# Altium footprint library CONN_HDR_MINI_ST.PcbLib: 116 footprints (part 7 of 10)
Each footprint in its own frame and in the unit in brackets; x right, y up, seen from the top. Pads: shape width x height; smd on the part's side, far side on the other; paste and mask are expansions set on the pad; w line width, h text height; cw(c..) or ccw(c..) is an arc to the next point about the centre after c.
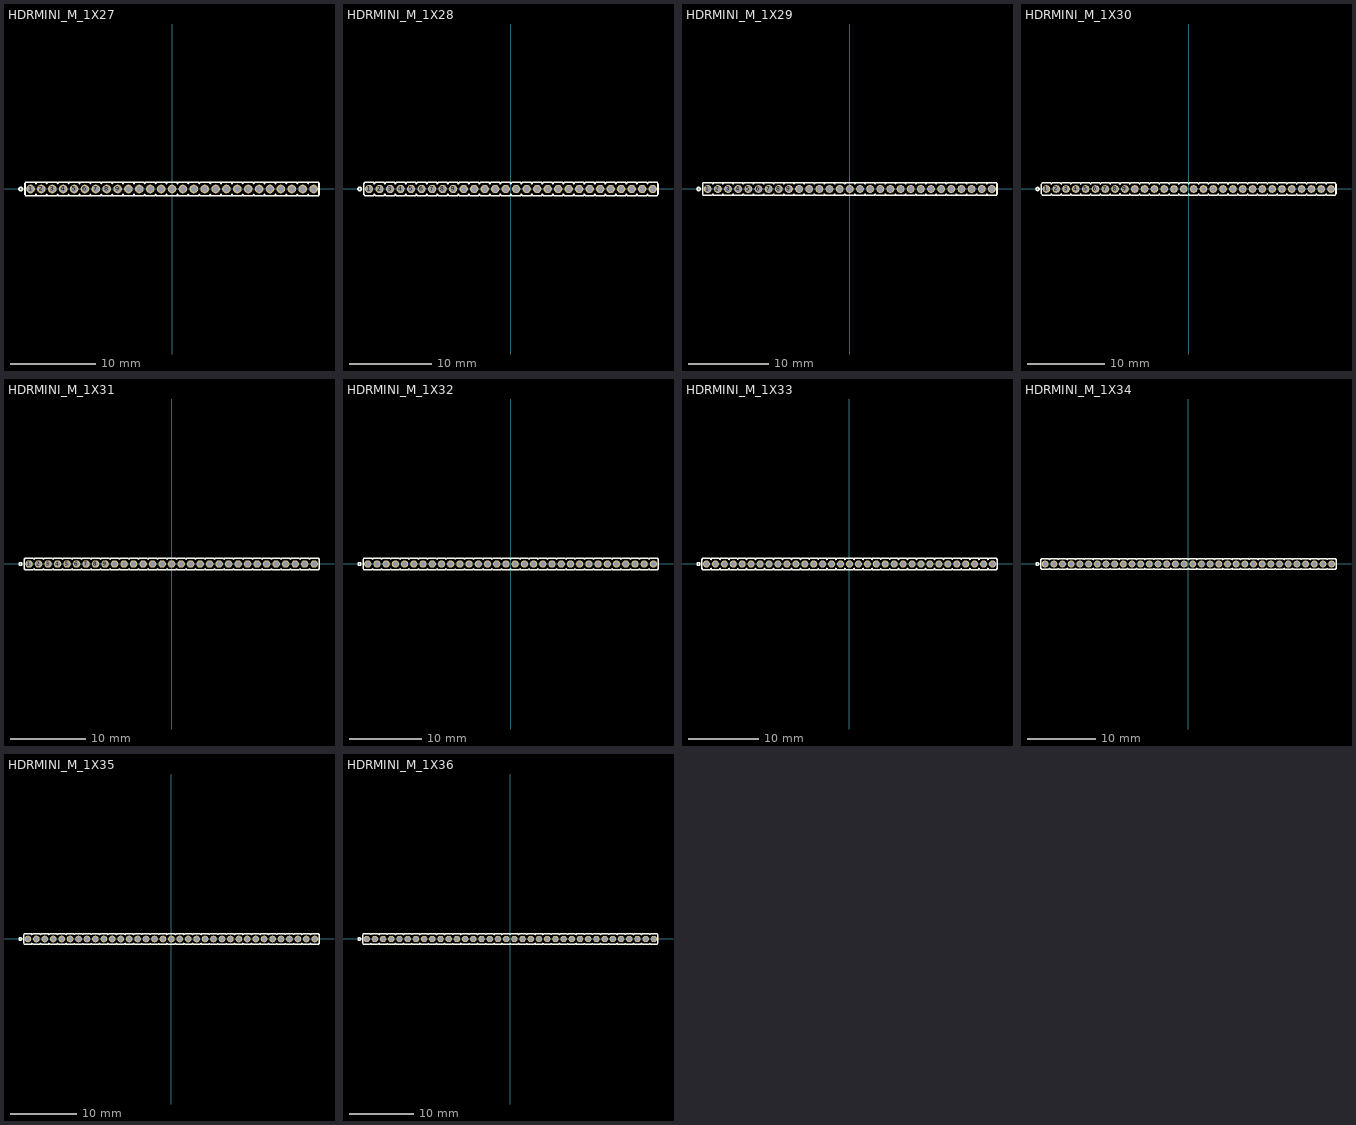
[diagram p6: the footprints below, top view; thin cyan lines are the x and y axes]

## HDRMINI_M_1X27 [mm] "mini header (50mil pitch)"
pads (27):
  round 1 / inner round 1 / far side oval 1x1.4 hole 0.7 mask+0.05: 1(-16.51,0) 2(-15.24,0) 3(-13.97,0) 4(-12.7,0) 5(-11.43,0) 6(-10.16,0) 7(-8.89,0) 8(-7.62,0) 9(-6.35,0) 10(-5.08,0) 11(-3.81,0) 12(-2.54,0) 13(-1.27,0) 14(0,0) 15(1.27,0) 16(2.54,0) 17(3.81,0) 18(5.08,0) 19(6.35,0) 20(7.62,0) 21(8.89,0) 22(10.16,0) 23(11.43,0) 24(12.7,0) 25(13.97,0) 26(15.24,0) 27(16.51,0)
Top Overlay:
  drawing of 165 lines, arcs and shapes, not listed
3D body: height 2.8, standoff 0, extent -6.985,-0.635 -5.715,0.635
3D body: height 7.3, standoff -2.5, extent -6.55,-0.2 -6.15,0.2
3D body: height 2.8, standoff 0, extent -8.255,-0.635 -6.985,0.635
3D body: height 7.3, standoff -2.5, extent -7.82,-0.2 -7.42,0.2
3D body: height 2.8, standoff 0, extent -9.525,-0.635 -8.255,0.635
3D body: height 7.3, standoff -2.5, extent -9.09,-0.2 -8.69,0.2
3D body: height 2.8, standoff 0, extent -10.795,-0.635 -9.525,0.635
3D body: height 7.3, standoff -2.5, extent -10.36,-0.2 -9.96,0.2
3D body: height 2.8, standoff 0, extent -12.065,-0.635 -10.795,0.635
3D body: height 7.3, standoff -2.5, extent -11.63,-0.2 -11.23,0.2
3D body: height 2.8, standoff 0, extent -13.335,-0.635 -12.065,0.635
3D body: height 7.3, standoff -2.5, extent -12.9,-0.2 -12.5,0.2
3D body: height 2.8, standoff 0, extent -14.605,-0.635 -13.335,0.635
3D body: height 7.3, standoff -2.5, extent -14.17,-0.2 -13.77,0.2
3D body: height 2.8, standoff 0, extent -15.875,-0.635 -14.605,0.635
3D body: height 7.3, standoff -2.5, extent -15.44,-0.2 -15.04,0.2
3D body: height 2.8, standoff 0, extent -17.145,-0.635 -15.875,0.635
3D body: height 7.3, standoff -2.5, extent -16.71,-0.2 -16.31,0.2
3D body: height 2.8, standoff 0, extent -5.715,-0.635 -4.445,0.635
3D body: height 7.3, standoff -2.5, extent -5.28,-0.2 -4.88,0.2
3D body: height 2.8, standoff 0, extent 5.715,-0.635 6.985,0.635
3D body: height 7.3, standoff -2.5, extent 6.15,-0.2 6.55,0.2
3D body: height 2.8, standoff 0, extent 4.445,-0.635 5.715,0.635
3D body: height 7.3, standoff -2.5, extent 4.88,-0.2 5.28,0.2
3D body: height 2.8, standoff 0, extent 3.175,-0.635 4.445,0.635
3D body: height 7.3, standoff -2.5, extent 3.61,-0.2 4.01,0.2
3D body: height 2.8, standoff 0, extent 1.905,-0.635 3.175,0.635
3D body: height 7.3, standoff -2.5, extent 2.34,-0.2 2.74,0.2
3D body: height 2.8, standoff 0, extent 0.635,-0.635 1.905,0.635
3D body: height 7.3, standoff -2.5, extent 1.07,-0.2 1.47,0.2
3D body: height 2.8, standoff 0, extent -0.635,-0.635 0.635,0.635
3D body: height 7.3, standoff -2.5, extent -0.2,-0.2 0.2,0.2
3D body: height 2.8, standoff 0, extent -1.905,-0.635 -0.635,0.635
3D body: height 7.3, standoff -2.5, extent -1.47,-0.2 -1.07,0.2
3D body: height 2.8, standoff 0, extent -3.175,-0.635 -1.905,0.635
3D body: height 7.3, standoff -2.5, extent -2.74,-0.2 -2.34,0.2
3D body: height 2.8, standoff 0, extent -4.445,-0.635 -3.175,0.635
3D body: height 7.3, standoff -2.5, extent -4.01,-0.2 -3.61,0.2
3D body: height 2.8, standoff 0, extent 6.985,-0.635 8.255,0.635
3D body: height 7.3, standoff -2.5, extent 7.42,-0.2 7.82,0.2
3D body: height 2.8, standoff 0, extent 15.875,-0.635 17.145,0.635
3D body: height 7.3, standoff -2.5, extent 16.31,-0.2 16.71,0.2
3D body: height 2.8, standoff 0, extent 14.605,-0.635 15.875,0.635
3D body: height 7.3, standoff -2.5, extent 15.04,-0.2 15.44,0.2
3D body: height 2.8, standoff 0, extent 13.335,-0.635 14.605,0.635
3D body: height 7.3, standoff -2.5, extent 13.77,-0.2 14.17,0.2
3D body: height 2.8, standoff 0, extent 12.065,-0.635 13.335,0.635
3D body: height 7.3, standoff -2.5, extent 12.5,-0.2 12.9,0.2
3D body: height 2.8, standoff 0, extent 10.795,-0.635 12.065,0.635
3D body: height 7.3, standoff -2.5, extent 11.23,-0.2 11.63,0.2
3D body: height 2.8, standoff 0, extent 9.525,-0.635 10.795,0.635
3D body: height 7.3, standoff -2.5, extent 9.96,-0.2 10.36,0.2
3D body: height 2.8, standoff 0, extent 8.255,-0.635 9.525,0.635
3D body: height 7.3, standoff -2.5, extent 8.69,-0.2 9.09,0.2

## HDRMINI_M_1X28 [mm] "mini header (50mil pitch)"
pads (28):
  round 1 / inner round 1 / far side oval 1x1.4 hole 0.7 mask+0.05: 1(-17.145,0) 2(-15.875,0) 3(-14.605,0) 4(-13.335,0) 5(-12.065,0) 6(-10.795,0) 7(-9.525,0) 8(-8.255,0) 9(-6.985,0) 10(-5.715,0) 11(-4.445,0) 12(-3.175,0) 13(-1.905,0) 14(-0.635,0) 15(0.635,0) 16(1.905,0) 17(3.175,0) 18(4.445,0) 19(5.715,0) 20(6.985,0) 21(8.255,0) 22(9.525,0) 23(10.795,0) 24(12.065,0) 25(13.335,0) 26(14.605,0) 27(15.875,0) 28(17.145,0)
Top Overlay:
  drawing of 171 lines, arcs and shapes, not listed
3D body: height 2.8, standoff 0, extent -7.62,-0.635 -6.35,0.635
3D body: height 7.3, standoff -2.5, extent -7.185,-0.2 -6.785,0.2
3D body: height 2.8, standoff 0, extent -8.89,-0.635 -7.62,0.635
3D body: height 7.3, standoff -2.5, extent -8.455,-0.2 -8.055,0.2
3D body: height 2.8, standoff 0, extent -10.16,-0.635 -8.89,0.635
3D body: height 7.3, standoff -2.5, extent -9.725,-0.2 -9.325,0.2
3D body: height 2.8, standoff 0, extent -11.43,-0.635 -10.16,0.635
3D body: height 7.3, standoff -2.5, extent -10.995,-0.2 -10.595,0.2
3D body: height 2.8, standoff 0, extent -12.7,-0.635 -11.43,0.635
3D body: height 7.3, standoff -2.5, extent -12.265,-0.2 -11.865,0.2
3D body: height 2.8, standoff 0, extent -13.97,-0.635 -12.7,0.635
3D body: height 7.3, standoff -2.5, extent -13.535,-0.2 -13.135,0.2
3D body: height 2.8, standoff 0, extent -15.24,-0.635 -13.97,0.635
3D body: height 7.3, standoff -2.5, extent -14.805,-0.2 -14.405,0.2
3D body: height 2.8, standoff 0, extent -16.51,-0.635 -15.24,0.635
3D body: height 7.3, standoff -2.5, extent -16.075,-0.2 -15.675,0.2
3D body: height 2.8, standoff 0, extent -17.78,-0.635 -16.51,0.635
3D body: height 7.3, standoff -2.5, extent -17.345,-0.2 -16.945,0.2
3D body: height 2.8, standoff 0, extent -6.35,-0.635 -5.08,0.635
3D body: height 7.3, standoff -2.5, extent -5.915,-0.2 -5.515,0.2
3D body: height 2.8, standoff 0, extent 5.08,-0.635 6.35,0.635
3D body: height 7.3, standoff -2.5, extent 5.515,-0.2 5.915,0.2
3D body: height 2.8, standoff 0, extent 3.81,-0.635 5.08,0.635
3D body: height 7.3, standoff -2.5, extent 4.245,-0.2 4.645,0.2
3D body: height 2.8, standoff 0, extent 2.54,-0.635 3.81,0.635
3D body: height 7.3, standoff -2.5, extent 2.975,-0.2 3.375,0.2
3D body: height 2.8, standoff 0, extent 1.27,-0.635 2.54,0.635
3D body: height 7.3, standoff -2.5, extent 1.705,-0.2 2.105,0.2
3D body: height 2.8, standoff 0, extent 0,-0.635 1.27,0.635
3D body: height 7.3, standoff -2.5, extent 0.435,-0.2 0.835,0.2
3D body: height 2.8, standoff 0, extent -1.27,-0.635 0,0.635
3D body: height 7.3, standoff -2.5, extent -0.835,-0.2 -0.435,0.2
3D body: height 2.8, standoff 0, extent -2.54,-0.635 -1.27,0.635
3D body: height 7.3, standoff -2.5, extent -2.105,-0.2 -1.705,0.2
3D body: height 2.8, standoff 0, extent -3.81,-0.635 -2.54,0.635
3D body: height 7.3, standoff -2.5, extent -3.375,-0.2 -2.975,0.2
3D body: height 2.8, standoff 0, extent -5.08,-0.635 -3.81,0.635
3D body: height 7.3, standoff -2.5, extent -4.645,-0.2 -4.245,0.2
3D body: height 2.8, standoff 0, extent 6.35,-0.635 7.62,0.635
3D body: height 7.3, standoff -2.5, extent 6.785,-0.2 7.185,0.2
3D body: height 2.8, standoff 0, extent 16.51,-0.635 17.78,0.635
3D body: height 7.3, standoff -2.5, extent 16.945,-0.2 17.345,0.2
3D body: height 2.8, standoff 0, extent 15.24,-0.635 16.51,0.635
3D body: height 7.3, standoff -2.5, extent 15.675,-0.2 16.075,0.2
3D body: height 2.8, standoff 0, extent 13.97,-0.635 15.24,0.635
3D body: height 7.3, standoff -2.5, extent 14.405,-0.2 14.805,0.2
3D body: height 2.8, standoff 0, extent 12.7,-0.635 13.97,0.635
3D body: height 7.3, standoff -2.5, extent 13.135,-0.2 13.535,0.2
3D body: height 2.8, standoff 0, extent 11.43,-0.635 12.7,0.635
3D body: height 7.3, standoff -2.5, extent 11.865,-0.2 12.265,0.2
3D body: height 2.8, standoff 0, extent 10.16,-0.635 11.43,0.635
3D body: height 7.3, standoff -2.5, extent 10.595,-0.2 10.995,0.2
3D body: height 2.8, standoff 0, extent 8.89,-0.635 10.16,0.635
3D body: height 7.3, standoff -2.5, extent 9.325,-0.2 9.725,0.2
3D body: height 2.8, standoff 0, extent 7.62,-0.635 8.89,0.635
3D body: height 7.3, standoff -2.5, extent 8.055,-0.2 8.455,0.2

## HDRMINI_M_1X29 [mm] "mini header (50mil pitch)"
pads (29):
  round 1 / inner round 1 / far side oval 1x1.4 hole 0.7 mask+0.05: 1(-17.78,0) 2(-16.51,0) 3(-15.24,0) 4(-13.97,0) 5(-12.7,0) 6(-11.43,0) 7(-10.16,0) 8(-8.89,0) 9(-7.62,0) 10(-6.35,0) 11(-5.08,0) 12(-3.81,0) 13(-2.54,0) 14(-1.27,0) 15(0,0) 16(1.27,0) 17(2.54,0) 18(3.81,0) 19(5.08,0) 20(6.35,0) 21(7.62,0) 22(8.89,0) 23(10.16,0) 24(11.43,0) 25(12.7,0) 26(13.97,0) 27(15.24,0) 28(16.51,0) 29(17.78,0)
Top Overlay:
  drawing of 177 lines, arcs and shapes, not listed
3D body: height 2.8, standoff 0, extent -8.255,-0.635 -6.985,0.635
3D body: height 7.3, standoff -2.5, extent -7.82,-0.2 -7.42,0.2
3D body: height 2.8, standoff 0, extent -9.525,-0.635 -8.255,0.635
3D body: height 7.3, standoff -2.5, extent -9.09,-0.2 -8.69,0.2
3D body: height 2.8, standoff 0, extent -10.795,-0.635 -9.525,0.635
3D body: height 7.3, standoff -2.5, extent -10.36,-0.2 -9.96,0.2
3D body: height 2.8, standoff 0, extent -12.065,-0.635 -10.795,0.635
3D body: height 7.3, standoff -2.5, extent -11.63,-0.2 -11.23,0.2
3D body: height 2.8, standoff 0, extent -13.335,-0.635 -12.065,0.635
3D body: height 7.3, standoff -2.5, extent -12.9,-0.2 -12.5,0.2
3D body: height 2.8, standoff 0, extent -14.605,-0.635 -13.335,0.635
3D body: height 7.3, standoff -2.5, extent -14.17,-0.2 -13.77,0.2
3D body: height 2.8, standoff 0, extent -15.875,-0.635 -14.605,0.635
3D body: height 7.3, standoff -2.5, extent -15.44,-0.2 -15.04,0.2
3D body: height 2.8, standoff 0, extent -17.145,-0.635 -15.875,0.635
3D body: height 7.3, standoff -2.5, extent -16.71,-0.2 -16.31,0.2
3D body: height 2.8, standoff 0, extent -18.415,-0.635 -17.145,0.635
3D body: height 7.3, standoff -2.5, extent -17.98,-0.2 -17.58,0.2
3D body: height 2.8, standoff 0, extent -6.985,-0.635 -5.715,0.635
3D body: height 7.3, standoff -2.5, extent -6.55,-0.2 -6.15,0.2
3D body: height 2.8, standoff 0, extent 4.445,-0.635 5.715,0.635
3D body: height 7.3, standoff -2.5, extent 4.88,-0.2 5.28,0.2
3D body: height 2.8, standoff 0, extent 3.175,-0.635 4.445,0.635
3D body: height 7.3, standoff -2.5, extent 3.61,-0.2 4.01,0.2
3D body: height 2.8, standoff 0, extent 1.905,-0.635 3.175,0.635
3D body: height 7.3, standoff -2.5, extent 2.34,-0.2 2.74,0.2
3D body: height 2.8, standoff 0, extent 0.635,-0.635 1.905,0.635
3D body: height 7.3, standoff -2.5, extent 1.07,-0.2 1.47,0.2
3D body: height 2.8, standoff 0, extent -0.635,-0.635 0.635,0.635
3D body: height 7.3, standoff -2.5, extent -0.2,-0.2 0.2,0.2
3D body: height 2.8, standoff 0, extent -1.905,-0.635 -0.635,0.635
3D body: height 7.3, standoff -2.5, extent -1.47,-0.2 -1.07,0.2
3D body: height 2.8, standoff 0, extent -3.175,-0.635 -1.905,0.635
3D body: height 7.3, standoff -2.5, extent -2.74,-0.2 -2.34,0.2
3D body: height 2.8, standoff 0, extent -4.445,-0.635 -3.175,0.635
3D body: height 7.3, standoff -2.5, extent -4.01,-0.2 -3.61,0.2
3D body: height 2.8, standoff 0, extent -5.715,-0.635 -4.445,0.635
3D body: height 7.3, standoff -2.5, extent -5.28,-0.2 -4.88,0.2
3D body: height 2.8, standoff 0, extent 5.715,-0.635 6.985,0.635
3D body: height 7.3, standoff -2.5, extent 6.15,-0.2 6.55,0.2
3D body: height 2.8, standoff 0, extent 17.145,-0.635 18.415,0.635
3D body: height 7.3, standoff -2.5, extent 17.58,-0.2 17.98,0.2
3D body: height 2.8, standoff 0, extent 15.875,-0.635 17.145,0.635
3D body: height 7.3, standoff -2.5, extent 16.31,-0.2 16.71,0.2
3D body: height 2.8, standoff 0, extent 14.605,-0.635 15.875,0.635
3D body: height 7.3, standoff -2.5, extent 15.04,-0.2 15.44,0.2
3D body: height 2.8, standoff 0, extent 13.335,-0.635 14.605,0.635
3D body: height 7.3, standoff -2.5, extent 13.77,-0.2 14.17,0.2
3D body: height 2.8, standoff 0, extent 12.065,-0.635 13.335,0.635
3D body: height 7.3, standoff -2.5, extent 12.5,-0.2 12.9,0.2
3D body: height 2.8, standoff 0, extent 10.795,-0.635 12.065,0.635
3D body: height 7.3, standoff -2.5, extent 11.23,-0.2 11.63,0.2
3D body: height 2.8, standoff 0, extent 9.525,-0.635 10.795,0.635
3D body: height 7.3, standoff -2.5, extent 9.96,-0.2 10.36,0.2
3D body: height 2.8, standoff 0, extent 8.255,-0.635 9.525,0.635
3D body: height 7.3, standoff -2.5, extent 8.69,-0.2 9.09,0.2
3D body: height 2.8, standoff 0, extent 6.985,-0.635 8.255,0.635
3D body: height 7.3, standoff -2.5, extent 7.42,-0.2 7.82,0.2

## HDRMINI_M_1X30 [mm] "mini header (50mil pitch)"
pads (30):
  round 1 / inner round 1 / far side oval 1x1.4 hole 0.7 mask+0.05: 1(-18.415,0) 2(-17.145,0) 3(-15.875,0) 4(-14.605,0) 5(-13.335,0) 6(-12.065,0) 7(-10.795,0) 8(-9.525,0) 9(-8.255,0) 10(-6.985,0) 11(-5.715,0) 12(-4.445,0) 13(-3.175,0) 14(-1.905,0) 15(-0.635,0) 16(0.635,0) 17(1.905,0) 18(3.175,0) 19(4.445,0) 20(5.715,0) 21(6.985,0) 22(8.255,0) 23(9.525,0) 24(10.795,0) 25(12.065,0) 26(13.335,0) 27(14.605,0) 28(15.875,0) 29(17.145,0) 30(18.415,0)
Top Overlay:
  drawing of 183 lines, arcs and shapes, not listed
3D body: height 2.8, standoff 0, extent -8.89,-0.635 -7.62,0.635
3D body: height 7.3, standoff -2.5, extent -8.455,-0.2 -8.055,0.2
3D body: height 2.8, standoff 0, extent -10.16,-0.635 -8.89,0.635
3D body: height 7.3, standoff -2.5, extent -9.725,-0.2 -9.325,0.2
3D body: height 2.8, standoff 0, extent -11.43,-0.635 -10.16,0.635
3D body: height 7.3, standoff -2.5, extent -10.995,-0.2 -10.595,0.2
3D body: height 2.8, standoff 0, extent -12.7,-0.635 -11.43,0.635
3D body: height 7.3, standoff -2.5, extent -12.265,-0.2 -11.865,0.2
3D body: height 2.8, standoff 0, extent -13.97,-0.635 -12.7,0.635
3D body: height 7.3, standoff -2.5, extent -13.535,-0.2 -13.135,0.2
3D body: height 2.8, standoff 0, extent -15.24,-0.635 -13.97,0.635
3D body: height 7.3, standoff -2.5, extent -14.805,-0.2 -14.405,0.2
3D body: height 2.8, standoff 0, extent -16.51,-0.635 -15.24,0.635
3D body: height 7.3, standoff -2.5, extent -16.075,-0.2 -15.675,0.2
3D body: height 2.8, standoff 0, extent -17.78,-0.635 -16.51,0.635
3D body: height 7.3, standoff -2.5, extent -17.345,-0.2 -16.945,0.2
3D body: height 2.8, standoff 0, extent -19.05,-0.635 -17.78,0.635
3D body: height 7.3, standoff -2.5, extent -18.615,-0.2 -18.215,0.2
3D body: height 2.8, standoff 0, extent -7.62,-0.635 -6.35,0.635
3D body: height 7.3, standoff -2.5, extent -7.185,-0.2 -6.785,0.2
3D body: height 2.8, standoff 0, extent 3.81,-0.635 5.08,0.635
3D body: height 7.3, standoff -2.5, extent 4.245,-0.2 4.645,0.2
3D body: height 2.8, standoff 0, extent 2.54,-0.635 3.81,0.635
3D body: height 7.3, standoff -2.5, extent 2.975,-0.2 3.375,0.2
3D body: height 2.8, standoff 0, extent 1.27,-0.635 2.54,0.635
3D body: height 7.3, standoff -2.5, extent 1.705,-0.2 2.105,0.2
3D body: height 2.8, standoff 0, extent 0,-0.635 1.27,0.635
3D body: height 7.3, standoff -2.5, extent 0.435,-0.2 0.835,0.2
3D body: height 2.8, standoff 0, extent -1.27,-0.635 0,0.635
3D body: height 7.3, standoff -2.5, extent -0.835,-0.2 -0.435,0.2
3D body: height 2.8, standoff 0, extent -2.54,-0.635 -1.27,0.635
3D body: height 7.3, standoff -2.5, extent -2.105,-0.2 -1.705,0.2
3D body: height 2.8, standoff 0, extent -3.81,-0.635 -2.54,0.635
3D body: height 7.3, standoff -2.5, extent -3.375,-0.2 -2.975,0.2
3D body: height 2.8, standoff 0, extent -5.08,-0.635 -3.81,0.635
3D body: height 7.3, standoff -2.5, extent -4.645,-0.2 -4.245,0.2
3D body: height 2.8, standoff 0, extent -6.35,-0.635 -5.08,0.635
3D body: height 7.3, standoff -2.5, extent -5.915,-0.2 -5.515,0.2
3D body: height 2.8, standoff 0, extent 5.08,-0.635 6.35,0.635
3D body: height 7.3, standoff -2.5, extent 5.515,-0.2 5.915,0.2
3D body: height 2.8, standoff 0, extent 16.51,-0.635 17.78,0.635
3D body: height 7.3, standoff -2.5, extent 16.945,-0.2 17.345,0.2
3D body: height 2.8, standoff 0, extent 15.24,-0.635 16.51,0.635
3D body: height 7.3, standoff -2.5, extent 15.675,-0.2 16.075,0.2
3D body: height 2.8, standoff 0, extent 13.97,-0.635 15.24,0.635
3D body: height 7.3, standoff -2.5, extent 14.405,-0.2 14.805,0.2
3D body: height 2.8, standoff 0, extent 12.7,-0.635 13.97,0.635
3D body: height 7.3, standoff -2.5, extent 13.135,-0.2 13.535,0.2
3D body: height 2.8, standoff 0, extent 11.43,-0.635 12.7,0.635
3D body: height 7.3, standoff -2.5, extent 11.865,-0.2 12.265,0.2
3D body: height 2.8, standoff 0, extent 10.16,-0.635 11.43,0.635
3D body: height 7.3, standoff -2.5, extent 10.595,-0.2 10.995,0.2
3D body: height 2.8, standoff 0, extent 8.89,-0.635 10.16,0.635
3D body: height 7.3, standoff -2.5, extent 9.325,-0.2 9.725,0.2
3D body: height 2.8, standoff 0, extent 7.62,-0.635 8.89,0.635
3D body: height 7.3, standoff -2.5, extent 8.055,-0.2 8.455,0.2
3D body: height 2.8, standoff 0, extent 6.35,-0.635 7.62,0.635
3D body: height 7.3, standoff -2.5, extent 6.785,-0.2 7.185,0.2
3D body: height 2.8, standoff 0, extent 17.78,-0.635 19.05,0.635
3D body: height 7.3, standoff -2.5, extent 18.215,-0.2 18.615,0.2

## HDRMINI_M_1X31 [mm] "mini header (50mil pitch)"
pads (31):
  round 1 / inner round 1 / far side oval 1x1.4 hole 0.7 mask+0.05: 1(-19.05,0) 2(-17.78,0) 3(-16.51,0) 4(-15.24,0) 5(-13.97,0) 6(-12.7,0) 7(-11.43,0) 8(-10.16,0) 9(-8.89,0) 10(-7.62,0) 11(-6.35,0) 12(-5.08,0) 13(-3.81,0) 14(-2.54,0) 15(-1.27,0) 16(0,0) 17(1.27,0) 18(2.54,0) 19(3.81,0) 20(5.08,0) 21(6.35,0) 22(7.62,0) 23(8.89,0) 24(10.16,0) 25(11.43,0) 26(12.7,0) 27(13.97,0) 28(15.24,0) 29(16.51,0) 30(17.78,0) 31(19.05,0)
Top Overlay:
  drawing of 189 lines, arcs and shapes, not listed
3D body: height 2.8, standoff 0, extent -9.525,-0.635 -8.255,0.635
3D body: height 7.3, standoff -2.5, extent -9.09,-0.2 -8.69,0.2
3D body: height 2.8, standoff 0, extent -10.795,-0.635 -9.525,0.635
3D body: height 7.3, standoff -2.5, extent -10.36,-0.2 -9.96,0.2
3D body: height 2.8, standoff 0, extent -12.065,-0.635 -10.795,0.635
3D body: height 7.3, standoff -2.5, extent -11.63,-0.2 -11.23,0.2
3D body: height 2.8, standoff 0, extent -13.335,-0.635 -12.065,0.635
3D body: height 7.3, standoff -2.5, extent -12.9,-0.2 -12.5,0.2
3D body: height 2.8, standoff 0, extent -14.605,-0.635 -13.335,0.635
3D body: height 7.3, standoff -2.5, extent -14.17,-0.2 -13.77,0.2
3D body: height 2.8, standoff 0, extent -15.875,-0.635 -14.605,0.635
3D body: height 7.3, standoff -2.5, extent -15.44,-0.2 -15.04,0.2
3D body: height 2.8, standoff 0, extent -17.145,-0.635 -15.875,0.635
3D body: height 7.3, standoff -2.5, extent -16.71,-0.2 -16.31,0.2
3D body: height 2.8, standoff 0, extent -18.415,-0.635 -17.145,0.635
3D body: height 7.3, standoff -2.5, extent -17.98,-0.2 -17.58,0.2
3D body: height 2.8, standoff 0, extent -19.685,-0.635 -18.415,0.635
3D body: height 7.3, standoff -2.5, extent -19.25,-0.2 -18.85,0.2
3D body: height 2.8, standoff 0, extent -8.255,-0.635 -6.985,0.635
3D body: height 7.3, standoff -2.5, extent -7.82,-0.2 -7.42,0.2
3D body: height 2.8, standoff 0, extent 3.175,-0.635 4.445,0.635
3D body: height 7.3, standoff -2.5, extent 3.61,-0.2 4.01,0.2
3D body: height 2.8, standoff 0, extent 1.905,-0.635 3.175,0.635
3D body: height 7.3, standoff -2.5, extent 2.34,-0.2 2.74,0.2
3D body: height 2.8, standoff 0, extent 0.635,-0.635 1.905,0.635
3D body: height 7.3, standoff -2.5, extent 1.07,-0.2 1.47,0.2
3D body: height 2.8, standoff 0, extent -0.635,-0.635 0.635,0.635
3D body: height 7.3, standoff -2.5, extent -0.2,-0.2 0.2,0.2
3D body: height 2.8, standoff 0, extent -1.905,-0.635 -0.635,0.635
3D body: height 7.3, standoff -2.5, extent -1.47,-0.2 -1.07,0.2
3D body: height 2.8, standoff 0, extent -3.175,-0.635 -1.905,0.635
3D body: height 7.3, standoff -2.5, extent -2.74,-0.2 -2.34,0.2
3D body: height 2.8, standoff 0, extent -4.445,-0.635 -3.175,0.635
3D body: height 7.3, standoff -2.5, extent -4.01,-0.2 -3.61,0.2
3D body: height 2.8, standoff 0, extent -5.715,-0.635 -4.445,0.635
3D body: height 7.3, standoff -2.5, extent -5.28,-0.2 -4.88,0.2
3D body: height 2.8, standoff 0, extent -6.985,-0.635 -5.715,0.635
3D body: height 7.3, standoff -2.5, extent -6.55,-0.2 -6.15,0.2
3D body: height 2.8, standoff 0, extent 4.445,-0.635 5.715,0.635
3D body: height 7.3, standoff -2.5, extent 4.88,-0.2 5.28,0.2
3D body: height 2.8, standoff 0, extent 15.875,-0.635 17.145,0.635
3D body: height 7.3, standoff -2.5, extent 16.31,-0.2 16.71,0.2
3D body: height 2.8, standoff 0, extent 14.605,-0.635 15.875,0.635
3D body: height 7.3, standoff -2.5, extent 15.04,-0.2 15.44,0.2
3D body: height 2.8, standoff 0, extent 13.335,-0.635 14.605,0.635
3D body: height 7.3, standoff -2.5, extent 13.77,-0.2 14.17,0.2
3D body: height 2.8, standoff 0, extent 12.065,-0.635 13.335,0.635
3D body: height 7.3, standoff -2.5, extent 12.5,-0.2 12.9,0.2
3D body: height 2.8, standoff 0, extent 10.795,-0.635 12.065,0.635
3D body: height 7.3, standoff -2.5, extent 11.23,-0.2 11.63,0.2
3D body: height 2.8, standoff 0, extent 9.525,-0.635 10.795,0.635
3D body: height 7.3, standoff -2.5, extent 9.96,-0.2 10.36,0.2
3D body: height 2.8, standoff 0, extent 8.255,-0.635 9.525,0.635
3D body: height 7.3, standoff -2.5, extent 8.69,-0.2 9.09,0.2
3D body: height 2.8, standoff 0, extent 6.985,-0.635 8.255,0.635
3D body: height 7.3, standoff -2.5, extent 7.42,-0.2 7.82,0.2
3D body: height 2.8, standoff 0, extent 5.715,-0.635 6.985,0.635
3D body: height 7.3, standoff -2.5, extent 6.15,-0.2 6.55,0.2
3D body: height 2.8, standoff 0, extent 17.145,-0.635 18.415,0.635
3D body: height 7.3, standoff -2.5, extent 17.58,-0.2 17.98,0.2
3D body: height 2.8, standoff 0, extent 18.415,-0.635 19.685,0.635
3D body: height 7.3, standoff -2.5, extent 18.85,-0.2 19.25,0.2

## HDRMINI_M_1X32 [mm] "mini header (50mil pitch)"
pads (32):
  round 1 / inner round 1 / far side oval 1x1.4 hole 0.7 mask+0.05: 1(-19.685,0) 2(-18.415,0) 3(-17.145,0) 4(-15.875,0) 5(-14.605,0) 6(-13.335,0) 7(-12.065,0) 8(-10.795,0) 9(-9.525,0) 10(-8.255,0) 11(-6.985,0) 12(-5.715,0) 13(-4.445,0) 14(-3.175,0) 15(-1.905,0) 16(-0.635,0) 17(0.635,0) 18(1.905,0) 19(3.175,0) 20(4.445,0) 21(5.715,0) 22(6.985,0) 23(8.255,0) 24(9.525,0) 25(10.795,0) 26(12.065,0) 27(13.335,0) 28(14.605,0) 29(15.875,0) 30(17.145,0) 31(18.415,0) 32(19.685,0)
Top Overlay:
  drawing of 195 lines, arcs and shapes, not listed
3D body: height 2.8, standoff 0, extent -10.16,-0.635 -8.89,0.635
3D body: height 7.3, standoff -2.5, extent -9.725,-0.2 -9.325,0.2
3D body: height 2.8, standoff 0, extent -11.43,-0.635 -10.16,0.635
3D body: height 7.3, standoff -2.5, extent -10.995,-0.2 -10.595,0.2
3D body: height 2.8, standoff 0, extent -12.7,-0.635 -11.43,0.635
3D body: height 7.3, standoff -2.5, extent -12.265,-0.2 -11.865,0.2
3D body: height 2.8, standoff 0, extent -13.97,-0.635 -12.7,0.635
3D body: height 7.3, standoff -2.5, extent -13.535,-0.2 -13.135,0.2
3D body: height 2.8, standoff 0, extent -15.24,-0.635 -13.97,0.635
3D body: height 7.3, standoff -2.5, extent -14.805,-0.2 -14.405,0.2
3D body: height 2.8, standoff 0, extent -16.51,-0.635 -15.24,0.635
3D body: height 7.3, standoff -2.5, extent -16.075,-0.2 -15.675,0.2
3D body: height 2.8, standoff 0, extent -17.78,-0.635 -16.51,0.635
3D body: height 7.3, standoff -2.5, extent -17.345,-0.2 -16.945,0.2
3D body: height 2.8, standoff 0, extent -19.05,-0.635 -17.78,0.635
3D body: height 7.3, standoff -2.5, extent -18.615,-0.2 -18.215,0.2
3D body: height 2.8, standoff 0, extent -20.32,-0.635 -19.05,0.635
3D body: height 7.3, standoff -2.5, extent -19.885,-0.2 -19.485,0.2
3D body: height 2.8, standoff 0, extent -8.89,-0.635 -7.62,0.635
3D body: height 7.3, standoff -2.5, extent -8.455,-0.2 -8.055,0.2
3D body: height 2.8, standoff 0, extent 2.54,-0.635 3.81,0.635
3D body: height 7.3, standoff -2.5, extent 2.975,-0.2 3.375,0.2
3D body: height 2.8, standoff 0, extent 1.27,-0.635 2.54,0.635
3D body: height 7.3, standoff -2.5, extent 1.705,-0.2 2.105,0.2
3D body: height 2.8, standoff 0, extent 0,-0.635 1.27,0.635
3D body: height 7.3, standoff -2.5, extent 0.435,-0.2 0.835,0.2
3D body: height 2.8, standoff 0, extent -1.27,-0.635 0,0.635
3D body: height 7.3, standoff -2.5, extent -0.835,-0.2 -0.435,0.2
3D body: height 2.8, standoff 0, extent -2.54,-0.635 -1.27,0.635
3D body: height 7.3, standoff -2.5, extent -2.105,-0.2 -1.705,0.2
3D body: height 2.8, standoff 0, extent -3.81,-0.635 -2.54,0.635
3D body: height 7.3, standoff -2.5, extent -3.375,-0.2 -2.975,0.2
3D body: height 2.8, standoff 0, extent -5.08,-0.635 -3.81,0.635
3D body: height 7.3, standoff -2.5, extent -4.645,-0.2 -4.245,0.2
3D body: height 2.8, standoff 0, extent -6.35,-0.635 -5.08,0.635
3D body: height 7.3, standoff -2.5, extent -5.915,-0.2 -5.515,0.2
3D body: height 2.8, standoff 0, extent -7.62,-0.635 -6.35,0.635
3D body: height 7.3, standoff -2.5, extent -7.185,-0.2 -6.785,0.2
3D body: height 2.8, standoff 0, extent 3.81,-0.635 5.08,0.635
3D body: height 7.3, standoff -2.5, extent 4.245,-0.2 4.645,0.2
3D body: height 2.8, standoff 0, extent 15.24,-0.635 16.51,0.635
3D body: height 7.3, standoff -2.5, extent 15.675,-0.2 16.075,0.2
3D body: height 2.8, standoff 0, extent 13.97,-0.635 15.24,0.635
3D body: height 7.3, standoff -2.5, extent 14.405,-0.2 14.805,0.2
3D body: height 2.8, standoff 0, extent 12.7,-0.635 13.97,0.635
3D body: height 7.3, standoff -2.5, extent 13.135,-0.2 13.535,0.2
3D body: height 2.8, standoff 0, extent 11.43,-0.635 12.7,0.635
3D body: height 7.3, standoff -2.5, extent 11.865,-0.2 12.265,0.2
3D body: height 2.8, standoff 0, extent 10.16,-0.635 11.43,0.635
3D body: height 7.3, standoff -2.5, extent 10.595,-0.2 10.995,0.2
3D body: height 2.8, standoff 0, extent 8.89,-0.635 10.16,0.635
3D body: height 7.3, standoff -2.5, extent 9.325,-0.2 9.725,0.2
3D body: height 2.8, standoff 0, extent 7.62,-0.635 8.89,0.635
3D body: height 7.3, standoff -2.5, extent 8.055,-0.2 8.455,0.2
3D body: height 2.8, standoff 0, extent 6.35,-0.635 7.62,0.635
3D body: height 7.3, standoff -2.5, extent 6.785,-0.2 7.185,0.2
3D body: height 2.8, standoff 0, extent 5.08,-0.635 6.35,0.635
3D body: height 7.3, standoff -2.5, extent 5.515,-0.2 5.915,0.2
3D body: height 2.8, standoff 0, extent 16.51,-0.635 17.78,0.635
3D body: height 7.3, standoff -2.5, extent 16.945,-0.2 17.345,0.2
3D body: height 2.8, standoff 0, extent 19.05,-0.635 20.32,0.635
3D body: height 7.3, standoff -2.5, extent 19.485,-0.2 19.885,0.2
3D body: height 2.8, standoff 0, extent 17.78,-0.635 19.05,0.635
3D body: height 7.3, standoff -2.5, extent 18.215,-0.2 18.615,0.2

## HDRMINI_M_1X33 [mm] "mini header (50mil pitch)"
pads (33):
  round 1 / inner round 1 / far side oval 1x1.4 hole 0.7 mask+0.05: 1(-20.32,0) 2(-19.05,0) 3(-17.78,0) 4(-16.51,0) 5(-15.24,0) 6(-13.97,0) 7(-12.7,0) 8(-11.43,0) 9(-10.16,0) 10(-8.89,0) 11(-7.62,0) 12(-6.35,0) 13(-5.08,0) 14(-3.81,0) 15(-2.54,0) 16(-1.27,0) 17(0,0) 18(1.27,0) 19(2.54,0) 20(3.81,0) 21(5.08,0) 22(6.35,0) 23(7.62,0) 24(8.89,0) 25(10.16,0) 26(11.43,0) 27(12.7,0) 28(13.97,0) 29(15.24,0) 30(16.51,0) 31(17.78,0) 32(19.05,0) 33(20.32,0)
Top Overlay:
  drawing of 201 lines, arcs and shapes, not listed
3D body: height 2.8, standoff 0, extent -10.795,-0.635 -9.525,0.635
3D body: height 7.3, standoff -2.5, extent -10.36,-0.2 -9.96,0.2
3D body: height 2.8, standoff 0, extent -12.065,-0.635 -10.795,0.635
3D body: height 7.3, standoff -2.5, extent -11.63,-0.2 -11.23,0.2
3D body: height 2.8, standoff 0, extent -13.335,-0.635 -12.065,0.635
3D body: height 7.3, standoff -2.5, extent -12.9,-0.2 -12.5,0.2
3D body: height 2.8, standoff 0, extent -14.605,-0.635 -13.335,0.635
3D body: height 7.3, standoff -2.5, extent -14.17,-0.2 -13.77,0.2
3D body: height 2.8, standoff 0, extent -15.875,-0.635 -14.605,0.635
3D body: height 7.3, standoff -2.5, extent -15.44,-0.2 -15.04,0.2
3D body: height 2.8, standoff 0, extent -17.145,-0.635 -15.875,0.635
3D body: height 7.3, standoff -2.5, extent -16.71,-0.2 -16.31,0.2
3D body: height 2.8, standoff 0, extent -18.415,-0.635 -17.145,0.635
3D body: height 7.3, standoff -2.5, extent -17.98,-0.2 -17.58,0.2
3D body: height 2.8, standoff 0, extent -19.685,-0.635 -18.415,0.635
3D body: height 7.3, standoff -2.5, extent -19.25,-0.2 -18.85,0.2
3D body: height 2.8, standoff 0, extent -20.955,-0.635 -19.685,0.635
3D body: height 7.3, standoff -2.5, extent -20.52,-0.2 -20.12,0.2
3D body: height 2.8, standoff 0, extent -9.525,-0.635 -8.255,0.635
3D body: height 7.3, standoff -2.5, extent -9.09,-0.2 -8.69,0.2
3D body: height 2.8, standoff 0, extent 1.905,-0.635 3.175,0.635
3D body: height 7.3, standoff -2.5, extent 2.34,-0.2 2.74,0.2
3D body: height 2.8, standoff 0, extent 0.635,-0.635 1.905,0.635
3D body: height 7.3, standoff -2.5, extent 1.07,-0.2 1.47,0.2
3D body: height 2.8, standoff 0, extent -0.635,-0.635 0.635,0.635
3D body: height 7.3, standoff -2.5, extent -0.2,-0.2 0.2,0.2
3D body: height 2.8, standoff 0, extent -1.905,-0.635 -0.635,0.635
3D body: height 7.3, standoff -2.5, extent -1.47,-0.2 -1.07,0.2
3D body: height 2.8, standoff 0, extent -3.175,-0.635 -1.905,0.635
3D body: height 7.3, standoff -2.5, extent -2.74,-0.2 -2.34,0.2
3D body: height 2.8, standoff 0, extent -4.445,-0.635 -3.175,0.635
3D body: height 7.3, standoff -2.5, extent -4.01,-0.2 -3.61,0.2
3D body: height 2.8, standoff 0, extent -5.715,-0.635 -4.445,0.635
3D body: height 7.3, standoff -2.5, extent -5.28,-0.2 -4.88,0.2
3D body: height 2.8, standoff 0, extent -6.985,-0.635 -5.715,0.635
3D body: height 7.3, standoff -2.5, extent -6.55,-0.2 -6.15,0.2
3D body: height 2.8, standoff 0, extent -8.255,-0.635 -6.985,0.635
3D body: height 7.3, standoff -2.5, extent -7.82,-0.2 -7.42,0.2
3D body: height 2.8, standoff 0, extent 3.175,-0.635 4.445,0.635
3D body: height 7.3, standoff -2.5, extent 3.61,-0.2 4.01,0.2
3D body: height 2.8, standoff 0, extent 14.605,-0.635 15.875,0.635
3D body: height 7.3, standoff -2.5, extent 15.04,-0.2 15.44,0.2
3D body: height 2.8, standoff 0, extent 13.335,-0.635 14.605,0.635
3D body: height 7.3, standoff -2.5, extent 13.77,-0.2 14.17,0.2
3D body: height 2.8, standoff 0, extent 12.065,-0.635 13.335,0.635
3D body: height 7.3, standoff -2.5, extent 12.5,-0.2 12.9,0.2
3D body: height 2.8, standoff 0, extent 10.795,-0.635 12.065,0.635
3D body: height 7.3, standoff -2.5, extent 11.23,-0.2 11.63,0.2
3D body: height 2.8, standoff 0, extent 9.525,-0.635 10.795,0.635
3D body: height 7.3, standoff -2.5, extent 9.96,-0.2 10.36,0.2
3D body: height 2.8, standoff 0, extent 8.255,-0.635 9.525,0.635
3D body: height 7.3, standoff -2.5, extent 8.69,-0.2 9.09,0.2
3D body: height 2.8, standoff 0, extent 6.985,-0.635 8.255,0.635
3D body: height 7.3, standoff -2.5, extent 7.42,-0.2 7.82,0.2
3D body: height 2.8, standoff 0, extent 5.715,-0.635 6.985,0.635
3D body: height 7.3, standoff -2.5, extent 6.15,-0.2 6.55,0.2
3D body: height 2.8, standoff 0, extent 4.445,-0.635 5.715,0.635
3D body: height 7.3, standoff -2.5, extent 4.88,-0.2 5.28,0.2
3D body: height 2.8, standoff 0, extent 15.875,-0.635 17.145,0.635
3D body: height 7.3, standoff -2.5, extent 16.31,-0.2 16.71,0.2
3D body: height 2.8, standoff 0, extent 19.685,-0.635 20.955,0.635
3D body: height 7.3, standoff -2.5, extent 20.12,-0.2 20.52,0.2
3D body: height 2.8, standoff 0, extent 18.415,-0.635 19.685,0.635
3D body: height 7.3, standoff -2.5, extent 18.85,-0.2 19.25,0.2
3D body: height 2.8, standoff 0, extent 17.145,-0.635 18.415,0.635
3D body: height 7.3, standoff -2.5, extent 17.58,-0.2 17.98,0.2

## HDRMINI_M_1X34 [mm] "mini header (50mil pitch)"
pads (34):
  round 1 / inner round 1 / far side oval 1x1.4 hole 0.7 mask+0.05: 1(-20.955,0) 2(-19.685,0) 3(-18.415,0) 4(-17.145,0) 5(-15.875,0) 6(-14.605,0) 7(-13.335,0) 8(-12.065,0) 9(-10.795,0) 10(-9.525,0) 11(-8.255,0) 12(-6.985,0) 13(-5.715,0) 14(-4.445,0) 15(-3.175,0) 16(-1.905,0) 17(-0.635,0) 18(0.635,0) 19(1.905,0) 20(3.175,0) 21(4.445,0) 22(5.715,0) 23(6.985,0) 24(8.255,0) 25(9.525,0) 26(10.795,0) 27(12.065,0) 28(13.335,0) 29(14.605,0) 30(15.875,0) 31(17.145,0) 32(18.415,0) 33(19.685,0) 34(20.955,0)
Top Overlay:
  drawing of 207 lines, arcs and shapes, not listed
3D body: height 2.8, standoff 0, extent -11.43,-0.635 -10.16,0.635
3D body: height 7.3, standoff -2.5, extent -10.995,-0.2 -10.595,0.2
3D body: height 2.8, standoff 0, extent -12.7,-0.635 -11.43,0.635
3D body: height 7.3, standoff -2.5, extent -12.265,-0.2 -11.865,0.2
3D body: height 2.8, standoff 0, extent -13.97,-0.635 -12.7,0.635
3D body: height 7.3, standoff -2.5, extent -13.535,-0.2 -13.135,0.2
3D body: height 2.8, standoff 0, extent -15.24,-0.635 -13.97,0.635
3D body: height 7.3, standoff -2.5, extent -14.805,-0.2 -14.405,0.2
3D body: height 2.8, standoff 0, extent -16.51,-0.635 -15.24,0.635
3D body: height 7.3, standoff -2.5, extent -16.075,-0.2 -15.675,0.2
3D body: height 2.8, standoff 0, extent -17.78,-0.635 -16.51,0.635
3D body: height 7.3, standoff -2.5, extent -17.345,-0.2 -16.945,0.2
3D body: height 2.8, standoff 0, extent -19.05,-0.635 -17.78,0.635
3D body: height 7.3, standoff -2.5, extent -18.615,-0.2 -18.215,0.2
3D body: height 2.8, standoff 0, extent -20.32,-0.635 -19.05,0.635
3D body: height 7.3, standoff -2.5, extent -19.885,-0.2 -19.485,0.2
3D body: height 2.8, standoff 0, extent -21.59,-0.635 -20.32,0.635
3D body: height 7.3, standoff -2.5, extent -21.155,-0.2 -20.755,0.2
3D body: height 2.8, standoff 0, extent -10.16,-0.635 -8.89,0.635
3D body: height 7.3, standoff -2.5, extent -9.725,-0.2 -9.325,0.2
3D body: height 2.8, standoff 0, extent 1.27,-0.635 2.54,0.635
3D body: height 7.3, standoff -2.5, extent 1.705,-0.2 2.105,0.2
3D body: height 2.8, standoff 0, extent 0,-0.635 1.27,0.635
3D body: height 7.3, standoff -2.5, extent 0.435,-0.2 0.835,0.2
3D body: height 2.8, standoff 0, extent -1.27,-0.635 0,0.635
3D body: height 7.3, standoff -2.5, extent -0.835,-0.2 -0.435,0.2
3D body: height 2.8, standoff 0, extent -2.54,-0.635 -1.27,0.635
3D body: height 7.3, standoff -2.5, extent -2.105,-0.2 -1.705,0.2
3D body: height 2.8, standoff 0, extent -3.81,-0.635 -2.54,0.635
3D body: height 7.3, standoff -2.5, extent -3.375,-0.2 -2.975,0.2
3D body: height 2.8, standoff 0, extent -5.08,-0.635 -3.81,0.635
3D body: height 7.3, standoff -2.5, extent -4.645,-0.2 -4.245,0.2
3D body: height 2.8, standoff 0, extent -6.35,-0.635 -5.08,0.635
3D body: height 7.3, standoff -2.5, extent -5.915,-0.2 -5.515,0.2
3D body: height 2.8, standoff 0, extent -7.62,-0.635 -6.35,0.635
3D body: height 7.3, standoff -2.5, extent -7.185,-0.2 -6.785,0.2
3D body: height 2.8, standoff 0, extent -8.89,-0.635 -7.62,0.635
3D body: height 7.3, standoff -2.5, extent -8.455,-0.2 -8.055,0.2
3D body: height 2.8, standoff 0, extent 2.54,-0.635 3.81,0.635
3D body: height 7.3, standoff -2.5, extent 2.975,-0.2 3.375,0.2
3D body: height 2.8, standoff 0, extent 13.97,-0.635 15.24,0.635
3D body: height 7.3, standoff -2.5, extent 14.405,-0.2 14.805,0.2
3D body: height 2.8, standoff 0, extent 12.7,-0.635 13.97,0.635
3D body: height 7.3, standoff -2.5, extent 13.135,-0.2 13.535,0.2
3D body: height 2.8, standoff 0, extent 11.43,-0.635 12.7,0.635
3D body: height 7.3, standoff -2.5, extent 11.865,-0.2 12.265,0.2
3D body: height 2.8, standoff 0, extent 10.16,-0.635 11.43,0.635
3D body: height 7.3, standoff -2.5, extent 10.595,-0.2 10.995,0.2
3D body: height 2.8, standoff 0, extent 8.89,-0.635 10.16,0.635
3D body: height 7.3, standoff -2.5, extent 9.325,-0.2 9.725,0.2
3D body: height 2.8, standoff 0, extent 7.62,-0.635 8.89,0.635
3D body: height 7.3, standoff -2.5, extent 8.055,-0.2 8.455,0.2
3D body: height 2.8, standoff 0, extent 6.35,-0.635 7.62,0.635
3D body: height 7.3, standoff -2.5, extent 6.785,-0.2 7.185,0.2
3D body: height 2.8, standoff 0, extent 5.08,-0.635 6.35,0.635
3D body: height 7.3, standoff -2.5, extent 5.515,-0.2 5.915,0.2
3D body: height 2.8, standoff 0, extent 3.81,-0.635 5.08,0.635
3D body: height 7.3, standoff -2.5, extent 4.245,-0.2 4.645,0.2
3D body: height 2.8, standoff 0, extent 15.24,-0.635 16.51,0.635
3D body: height 7.3, standoff -2.5, extent 15.675,-0.2 16.075,0.2
3D body: height 2.8, standoff 0, extent 20.32,-0.635 21.59,0.635
3D body: height 7.3, standoff -2.5, extent 20.755,-0.2 21.155,0.2
3D body: height 2.8, standoff 0, extent 19.05,-0.635 20.32,0.635
3D body: height 7.3, standoff -2.5, extent 19.485,-0.2 19.885,0.2
3D body: height 2.8, standoff 0, extent 17.78,-0.635 19.05,0.635
3D body: height 7.3, standoff -2.5, extent 18.215,-0.2 18.615,0.2
3D body: height 2.8, standoff 0, extent 16.51,-0.635 17.78,0.635
3D body: height 7.3, standoff -2.5, extent 16.945,-0.2 17.345,0.2

## HDRMINI_M_1X35 [mm] "mini header (50mil pitch)"
pads (35):
  round 1 / inner round 1 / far side oval 1x1.4 hole 0.7 mask+0.05: 1(-21.59,0) 2(-20.32,0) 3(-19.05,0) 4(-17.78,0) 5(-16.51,0) 6(-15.24,0) 7(-13.97,0) 8(-12.7,0) 9(-11.43,0) 10(-10.16,0) 11(-8.89,0) 12(-7.62,0) 13(-6.35,0) 14(-5.08,0) 15(-3.81,0) 16(-2.54,0) 17(-1.27,0) 18(0,0) 19(1.27,0) 20(2.54,0) 21(3.81,0) 22(5.08,0) 23(6.35,0) 24(7.62,0) 25(8.89,0) 26(10.16,0) 27(11.43,0) 28(12.7,0) 29(13.97,0) 30(15.24,0) 31(16.51,0) 32(17.78,0) 33(19.05,0) 34(20.32,0) 35(21.59,0)
Top Overlay:
  drawing of 213 lines, arcs and shapes, not listed
3D body: height 7.3, standoff -2.5, extent 16.31,-0.2 16.71,0.2
3D body: height 2.8, standoff 0, extent 15.875,-0.635 17.145,0.635
3D body: height 7.3, standoff -2.5, extent 17.58,-0.2 17.98,0.2
3D body: height 2.8, standoff 0, extent 17.145,-0.635 18.415,0.635
3D body: height 7.3, standoff -2.5, extent 18.85,-0.2 19.25,0.2
3D body: height 2.8, standoff 0, extent 18.415,-0.635 19.685,0.635
3D body: height 7.3, standoff -2.5, extent 20.12,-0.2 20.52,0.2
3D body: height 2.8, standoff 0, extent 19.685,-0.635 20.955,0.635
3D body: height 7.3, standoff -2.5, extent 21.39,-0.2 21.79,0.2
3D body: height 2.8, standoff 0, extent 20.955,-0.635 22.225,0.635
3D body: height 7.3, standoff -2.5, extent 15.04,-0.2 15.44,0.2
3D body: height 2.8, standoff 0, extent 14.605,-0.635 15.875,0.635
3D body: height 7.3, standoff -2.5, extent 3.61,-0.2 4.01,0.2
3D body: height 2.8, standoff 0, extent 3.175,-0.635 4.445,0.635
3D body: height 7.3, standoff -2.5, extent 4.88,-0.2 5.28,0.2
3D body: height 2.8, standoff 0, extent 4.445,-0.635 5.715,0.635
3D body: height 7.3, standoff -2.5, extent 6.15,-0.2 6.55,0.2
3D body: height 2.8, standoff 0, extent 5.715,-0.635 6.985,0.635
3D body: height 7.3, standoff -2.5, extent 7.42,-0.2 7.82,0.2
3D body: height 2.8, standoff 0, extent 6.985,-0.635 8.255,0.635
3D body: height 7.3, standoff -2.5, extent 8.69,-0.2 9.09,0.2
3D body: height 2.8, standoff 0, extent 8.255,-0.635 9.525,0.635
3D body: height 7.3, standoff -2.5, extent 9.96,-0.2 10.36,0.2
3D body: height 2.8, standoff 0, extent 9.525,-0.635 10.795,0.635
3D body: height 7.3, standoff -2.5, extent 11.23,-0.2 11.63,0.2
3D body: height 2.8, standoff 0, extent 10.795,-0.635 12.065,0.635
3D body: height 7.3, standoff -2.5, extent 12.5,-0.2 12.9,0.2
3D body: height 2.8, standoff 0, extent 12.065,-0.635 13.335,0.635
3D body: height 7.3, standoff -2.5, extent 13.77,-0.2 14.17,0.2
3D body: height 2.8, standoff 0, extent 13.335,-0.635 14.605,0.635
3D body: height 7.3, standoff -2.5, extent 2.34,-0.2 2.74,0.2
3D body: height 2.8, standoff 0, extent 1.905,-0.635 3.175,0.635
3D body: height 7.3, standoff -2.5, extent -9.09,-0.2 -8.69,0.2
3D body: height 2.8, standoff 0, extent -9.525,-0.635 -8.255,0.635
3D body: height 7.3, standoff -2.5, extent -7.82,-0.2 -7.42,0.2
3D body: height 2.8, standoff 0, extent -8.255,-0.635 -6.985,0.635
3D body: height 7.3, standoff -2.5, extent -6.55,-0.2 -6.15,0.2
3D body: height 2.8, standoff 0, extent -6.985,-0.635 -5.715,0.635
3D body: height 7.3, standoff -2.5, extent -5.28,-0.2 -4.88,0.2
3D body: height 2.8, standoff 0, extent -5.715,-0.635 -4.445,0.635
3D body: height 7.3, standoff -2.5, extent -4.01,-0.2 -3.61,0.2
3D body: height 2.8, standoff 0, extent -4.445,-0.635 -3.175,0.635
3D body: height 7.3, standoff -2.5, extent -2.74,-0.2 -2.34,0.2
3D body: height 2.8, standoff 0, extent -3.175,-0.635 -1.905,0.635
3D body: height 7.3, standoff -2.5, extent -1.47,-0.2 -1.07,0.2
3D body: height 2.8, standoff 0, extent -1.905,-0.635 -0.635,0.635
3D body: height 7.3, standoff -2.5, extent -0.2,-0.2 0.2,0.2
3D body: height 2.8, standoff 0, extent -0.635,-0.635 0.635,0.635
3D body: height 7.3, standoff -2.5, extent 1.07,-0.2 1.47,0.2
3D body: height 2.8, standoff 0, extent 0.635,-0.635 1.905,0.635
3D body: height 7.3, standoff -2.5, extent -10.36,-0.2 -9.96,0.2
3D body: height 2.8, standoff 0, extent -10.795,-0.635 -9.525,0.635
3D body: height 7.3, standoff -2.5, extent -21.79,-0.2 -21.39,0.2
3D body: height 2.8, standoff 0, extent -22.225,-0.635 -20.955,0.635
3D body: height 7.3, standoff -2.5, extent -20.52,-0.2 -20.12,0.2
3D body: height 2.8, standoff 0, extent -20.955,-0.635 -19.685,0.635
3D body: height 7.3, standoff -2.5, extent -19.25,-0.2 -18.85,0.2
3D body: height 2.8, standoff 0, extent -19.685,-0.635 -18.415,0.635
3D body: height 7.3, standoff -2.5, extent -17.98,-0.2 -17.58,0.2
3D body: height 2.8, standoff 0, extent -18.415,-0.635 -17.145,0.635
3D body: height 7.3, standoff -2.5, extent -16.71,-0.2 -16.31,0.2
3D body: height 2.8, standoff 0, extent -17.145,-0.635 -15.875,0.635
3D body: height 7.3, standoff -2.5, extent -15.44,-0.2 -15.04,0.2
3D body: height 2.8, standoff 0, extent -15.875,-0.635 -14.605,0.635
3D body: height 7.3, standoff -2.5, extent -14.17,-0.2 -13.77,0.2
3D body: height 2.8, standoff 0, extent -14.605,-0.635 -13.335,0.635
3D body: height 7.3, standoff -2.5, extent -12.9,-0.2 -12.5,0.2
3D body: height 2.8, standoff 0, extent -13.335,-0.635 -12.065,0.635
3D body: height 7.3, standoff -2.5, extent -11.63,-0.2 -11.23,0.2
3D body: height 2.8, standoff 0, extent -12.065,-0.635 -10.795,0.635

## HDRMINI_M_1X36 [mm] "mini header (50mil pitch)"
pads (36):
  round 1 / inner round 1 / far side oval 1x1.4 hole 0.7 mask+0.05: 1(-22.225,0) 2(-20.955,0) 3(-19.685,0) 4(-18.415,0) 5(-17.145,0) 6(-15.875,0) 7(-14.605,0) 8(-13.335,0) 9(-12.065,0) 10(-10.795,0) 11(-9.525,0) 12(-8.255,0) 13(-6.985,0) 14(-5.715,0) 15(-4.445,0) 16(-3.175,0) 17(-1.905,0) 18(-0.635,0) 19(0.635,0) 20(1.905,0) 21(3.175,0) 22(4.445,0) 23(5.715,0) 24(6.985,0) 25(8.255,0) 26(9.525,0) 27(10.795,0) 28(12.065,0) 29(13.335,0) 30(14.605,0) 31(15.875,0) 32(17.145,0) 33(18.415,0) 34(19.685,0) 35(20.955,0) 36(22.225,0)
Top Overlay:
  drawing of 219 lines, arcs and shapes, not listed
3D body: height 7.3, standoff -2.5, extent 15.675,-0.2 16.075,0.2
3D body: height 2.8, standoff 0, extent 15.24,-0.635 16.51,0.635
3D body: height 7.3, standoff -2.5, extent 16.945,-0.2 17.345,0.2
3D body: height 2.8, standoff 0, extent 16.51,-0.635 17.78,0.635
3D body: height 7.3, standoff -2.5, extent 18.215,-0.2 18.615,0.2
3D body: height 2.8, standoff 0, extent 17.78,-0.635 19.05,0.635
3D body: height 7.3, standoff -2.5, extent 19.485,-0.2 19.885,0.2
3D body: height 2.8, standoff 0, extent 19.05,-0.635 20.32,0.635
3D body: height 7.3, standoff -2.5, extent 20.755,-0.2 21.155,0.2
3D body: height 2.8, standoff 0, extent 20.32,-0.635 21.59,0.635
3D body: height 7.3, standoff -2.5, extent 22.025,-0.2 22.425,0.2
3D body: height 2.8, standoff 0, extent 21.59,-0.635 22.86,0.635
3D body: height 7.3, standoff -2.5, extent 14.405,-0.2 14.805,0.2
3D body: height 2.8, standoff 0, extent 13.97,-0.635 15.24,0.635
3D body: height 7.3, standoff -2.5, extent 2.975,-0.2 3.375,0.2
3D body: height 2.8, standoff 0, extent 2.54,-0.635 3.81,0.635
3D body: height 7.3, standoff -2.5, extent 4.245,-0.2 4.645,0.2
3D body: height 2.8, standoff 0, extent 3.81,-0.635 5.08,0.635
3D body: height 7.3, standoff -2.5, extent 5.515,-0.2 5.915,0.2
3D body: height 2.8, standoff 0, extent 5.08,-0.635 6.35,0.635
3D body: height 7.3, standoff -2.5, extent 6.785,-0.2 7.185,0.2
3D body: height 2.8, standoff 0, extent 6.35,-0.635 7.62,0.635
3D body: height 7.3, standoff -2.5, extent 8.055,-0.2 8.455,0.2
3D body: height 2.8, standoff 0, extent 7.62,-0.635 8.89,0.635
3D body: height 7.3, standoff -2.5, extent 9.325,-0.2 9.725,0.2
3D body: height 2.8, standoff 0, extent 8.89,-0.635 10.16,0.635
3D body: height 7.3, standoff -2.5, extent 10.595,-0.2 10.995,0.2
3D body: height 2.8, standoff 0, extent 10.16,-0.635 11.43,0.635
3D body: height 7.3, standoff -2.5, extent 11.865,-0.2 12.265,0.2
3D body: height 2.8, standoff 0, extent 11.43,-0.635 12.7,0.635
3D body: height 7.3, standoff -2.5, extent 13.135,-0.2 13.535,0.2
3D body: height 2.8, standoff 0, extent 12.7,-0.635 13.97,0.635
3D body: height 7.3, standoff -2.5, extent 1.705,-0.2 2.105,0.2
3D body: height 2.8, standoff 0, extent 1.27,-0.635 2.54,0.635
3D body: height 7.3, standoff -2.5, extent -9.725,-0.2 -9.325,0.2
3D body: height 2.8, standoff 0, extent -10.16,-0.635 -8.89,0.635
3D body: height 7.3, standoff -2.5, extent -8.455,-0.2 -8.055,0.2
3D body: height 2.8, standoff 0, extent -8.89,-0.635 -7.62,0.635
3D body: height 7.3, standoff -2.5, extent -7.185,-0.2 -6.785,0.2
3D body: height 2.8, standoff 0, extent -7.62,-0.635 -6.35,0.635
3D body: height 7.3, standoff -2.5, extent -5.915,-0.2 -5.515,0.2
3D body: height 2.8, standoff 0, extent -6.35,-0.635 -5.08,0.635
3D body: height 7.3, standoff -2.5, extent -4.645,-0.2 -4.245,0.2
3D body: height 2.8, standoff 0, extent -5.08,-0.635 -3.81,0.635
3D body: height 7.3, standoff -2.5, extent -3.375,-0.2 -2.975,0.2
3D body: height 2.8, standoff 0, extent -3.81,-0.635 -2.54,0.635
3D body: height 7.3, standoff -2.5, extent -2.105,-0.2 -1.705,0.2
3D body: height 2.8, standoff 0, extent -2.54,-0.635 -1.27,0.635
3D body: height 7.3, standoff -2.5, extent -0.835,-0.2 -0.435,0.2
3D body: height 2.8, standoff 0, extent -1.27,-0.635 0,0.635
3D body: height 7.3, standoff -2.5, extent 0.435,-0.2 0.835,0.2
3D body: height 2.8, standoff 0, extent 0,-0.635 1.27,0.635
3D body: height 7.3, standoff -2.5, extent -10.995,-0.2 -10.595,0.2
3D body: height 2.8, standoff 0, extent -11.43,-0.635 -10.16,0.635
3D body: height 7.3, standoff -2.5, extent -22.425,-0.2 -22.025,0.2
3D body: height 2.8, standoff 0, extent -22.86,-0.635 -21.59,0.635
3D body: height 7.3, standoff -2.5, extent -21.155,-0.2 -20.755,0.2
3D body: height 2.8, standoff 0, extent -21.59,-0.635 -20.32,0.635
3D body: height 7.3, standoff -2.5, extent -19.885,-0.2 -19.485,0.2
3D body: height 2.8, standoff 0, extent -20.32,-0.635 -19.05,0.635
3D body: height 7.3, standoff -2.5, extent -18.615,-0.2 -18.215,0.2
3D body: height 2.8, standoff 0, extent -19.05,-0.635 -17.78,0.635
3D body: height 7.3, standoff -2.5, extent -17.345,-0.2 -16.945,0.2
3D body: height 2.8, standoff 0, extent -17.78,-0.635 -16.51,0.635
3D body: height 7.3, standoff -2.5, extent -16.075,-0.2 -15.675,0.2
3D body: height 2.8, standoff 0, extent -16.51,-0.635 -15.24,0.635
3D body: height 7.3, standoff -2.5, extent -14.805,-0.2 -14.405,0.2
3D body: height 2.8, standoff 0, extent -15.24,-0.635 -13.97,0.635
3D body: height 7.3, standoff -2.5, extent -13.535,-0.2 -13.135,0.2
3D body: height 2.8, standoff 0, extent -13.97,-0.635 -12.7,0.635
3D body: height 7.3, standoff -2.5, extent -12.265,-0.2 -11.865,0.2
3D body: height 2.8, standoff 0, extent -12.7,-0.635 -11.43,0.635